# Altium schematic symbol library BARKO_SCHLIB.SchLib: 1064 symbols (part 1 of 11)
Pins are listed as number, name and electrical type; pins without a type are passive.

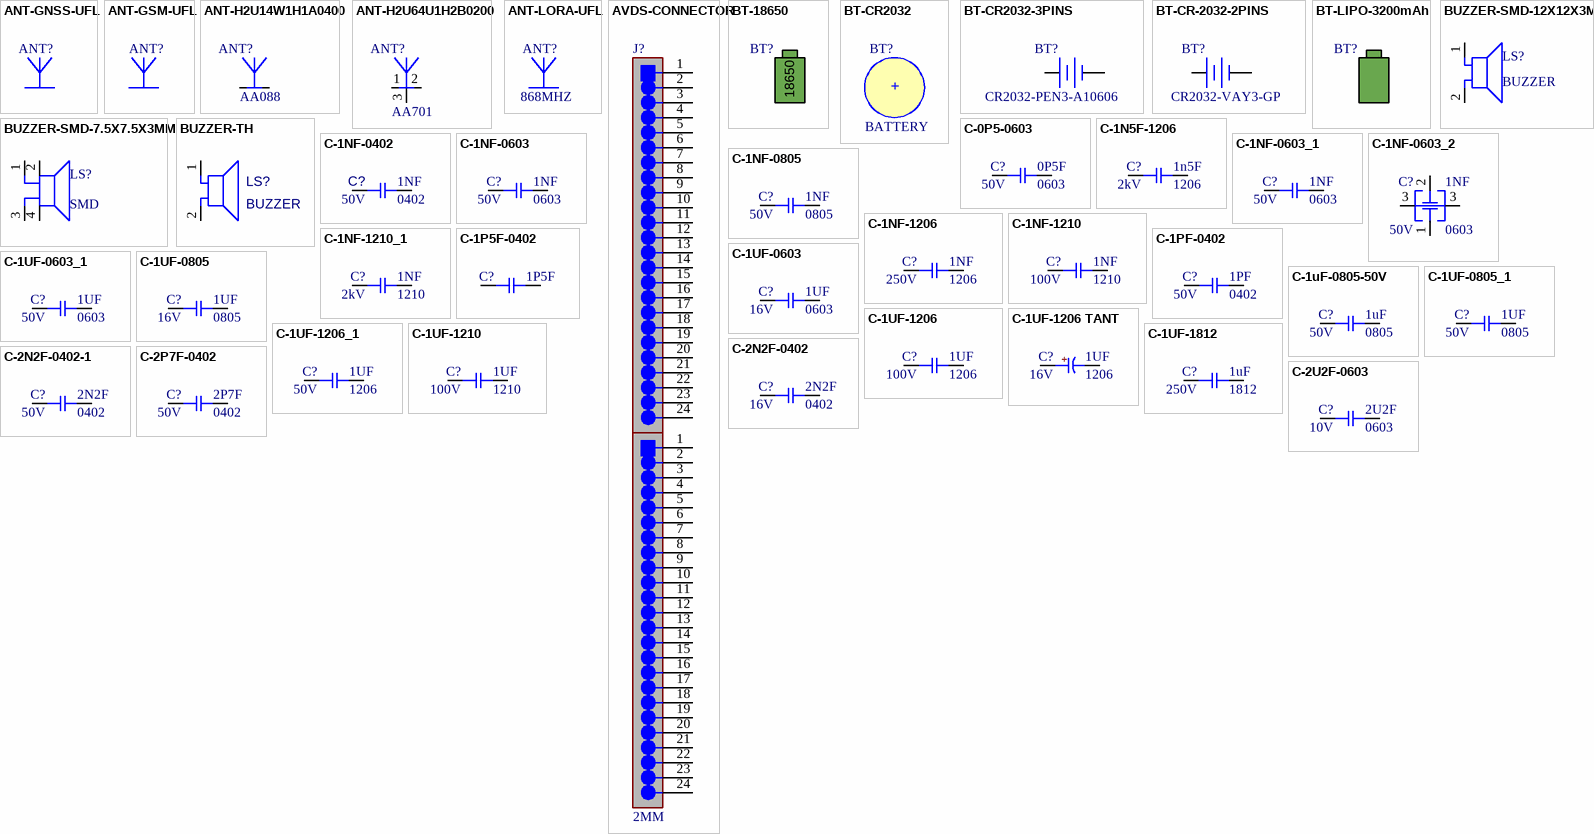
[diagram p0: symbols ANT-GNSS-UFL to C-2U2F-0603]

## ANT-GNSS-UFL
designator ANT?, comment 206560-0050  (value not drawn)  (net tie)
RF ANT 1.561/1.575GHZ FLAT 50MM; Manufacturer: Molex; Number of Bands: 3; Return Loss: -8dB; Washability: OK; .Creator: M.OZKAN; .PCBCHK: USED; Supplier: Digi-Key; Manufacturer Part Number: 206560-0050; RoHS: No; Supplier Part Number: WM22046-ND; Stock: 0; Supplier 1: Digi-Key; Supplier Part Number 1: WM22046-ND; Pricing: 1=2.8, 10=2.517, 25=2.3744, 100=2.0229, 250=1.8994, 500=1.662, 1000=1.3771, 2500=1.2821, 5000=1.2346 (USD); Mount: Adhesive; Termination: Cable; ComponentLink1URL: https://www.molex.com/pdm_docs/sd/2065600100_sd.pdf?src-supplier=Digi-Key; ComponentLink1Description: https://www.molex.com/pdm_docs/sd/2065600100_sd.pdf?src-supplier=Digi-Key; .SCHCHK: USED
footprint R-1206-ARRAY (SMD, 8-Leads, Body 1.6x3.2mm, Pitch 0.8mm)

## ANT-GSM-UFL
designator ANT?, comment ANT-GSMMQB-UFL  (value not drawn)  (net tie)
ANTENNA MINI GSM QUAD UF1 CONN; Manufacturer: RF Solutions; Number of Bands: 4; Gain: 1dB; Max Power Dissipation: 10W; Lead Length: 100mm; Washability: OK; .Creator: M.OZKAN; .PCBCHK: USED; Supplier: Digi-Key; Manufacturer Part Number: ANT-GSMMQB-UFL; Stock: 75; Pricing: 1=6,17000 (USD); RoHS: Yes; Mount: Adhesive; Termination: Connector; Package Quantity: 1; Height: 0.197inch; ComponentLink1URL: https://datasheet.ciiva.com/11768/0900766b80df9366-11768496.pdf?src-supplier=RSComponents; ComponentLink1Description: https://datasheet.ciiva.com/11768/0900766b80df9366-11768496.pdf?src-supplier=RSComponents; Supplier Part Number: ANT-GSMMQB-UFL-ND; Supplier 1: Digi-Key; Supplier Part Number 1: ANT-GSMMQB-UFL-ND; .SCHCHK: USED

## ANT-H2U14W1H1A0400
designator ANT?, comment AA088
GNSS 1560-1606 MHZ WIDE BAND TEL; Manufacturer Part Number: H2U14W1H1A0400; Washability: OK; .Creator: M.OZKAN; .PCBCHK: USED; ComponentLink1Description: Datasheet; ComponentLink1URL: https://www.unictron.com/wp-content/uploads/Unictron_AA088_GNSS_Chip_Antenna_F-1.pdf; .SCHCHK: USED
footprint ANT-GPS-2PIN (Chip Inductor, 2-Leads, Body 3.20x1.60mm, IPC Medium Density)
pins: 1 SIGNAL, 2

## ANT-H2U64U1H2B0200
designator ANT?, comment AA701
868MHZ ISM 863-870MHZ TELA CERAM; Manufacturer Part Number: H2U64U1H2B0200; Washability: OK; .Creator: M.OZKAN; .PCBCHK: USED; ComponentLink1Description: Datasheet; ComponentLink1URL: https://www.unictron.com/wp-content/uploads/Unictron_AA701_ISM_868MHz_Ceramic_Chip_Antenna_L.pdf; .SCHCHK: USED
footprint ANT-LORA-3PINS (Chip Inductor, 2-Leads, Body 5.00x3.00mm, IPC Medium Density)
pins: 1 SIGNAL, 2 Tuning/Ground, 3 NC

## ANT-LORA-UFL
designator ANT?, comment 868MHZ  (net tie)
RF ANTENNA ISM 868-870MHZ; Manufacturer: Ethertronics; Manufacturer Part Number: 1001826; Number of Bands: 1; Washability: OK; .Creator: M.OZKAN; .PCBCHK: USED; Supplier: Digi-Key; Stock: 10571; Pricing: 1=6,50000, 100=4,75000, 1000=4,35000 (USD); RoHS: Yes; Mount: Surface Mount; Termination: Connector; Package Quantity: 1000; Packaging: Bulk; Height: 0.031inch; ComponentLink1URL: https://datasheet.ciiva.com/29647/1001826-may2013-29647348.pdf?src-supplier=Digi-Key; ComponentLink1Description: https://datasheet.ciiva.com/29647/1001826-may2013-29647348.pdf?src-supplier=Digi-Key; Supplier Part Number: 939-1044-ND; Supplier 1: Digi-Key; Supplier Part Number 1: 939-1044-ND; .SCHCHK: USED

## AVDS-CONNECTOR
designator J?, comment 2MM
Washability: OK; .Creator: M.OZKAN; .PCBCHK: USED; .SCHCHK: USED
footprint AVDS-MODUL-HEADER
pins: 1, 1, 2, 2, 3, 3, 4, 4, 5, 5, 6, 6, 7, 7, 8, 8, 9, 9, 10, 10, 11, 11, 12, 12, 13, 13, 14, 14, 15, 15, 16, 16, 17, 17, 18, 18, 19, 19, 20, 20, 21, 21, 22, 22, 23, 23, 24, 24

## BT-18650
designator BT?, comment 18650
BATTERY LITHIUM 3.7V 2.6AH; Manufacturer 1: SparkFun; Manufacturer Part Number 1: PRT-13189; Washability: OK; .Creator: M.OZKAN; .PCBCHK: USED; Supplier 1: Digi-Key; Supplier Part Number 1: 1568-1490-ND; RoHS: No; Stock 1: 340; Pricing 1: 1=6.50000 (USD); Voltage Rating: 3.7V; Capacity: 2.6ah; Termination: Solder; ComponentLink1URL: https://cdn.sparkfun.com/datasheets/Prototyping/ICR18650%202600mAH%20datasheet.pdf?src-supplier=Digi-Key; ComponentLink1Description: https://cdn.sparkfun.com/datasheets/Prototyping/ICR18650%202600mAH%20datasheet.pdf?src-supplier=Digi-Key; .SCHCHK: USED

## BT-CR2032
designator BT?, comment BATTERY  (graphical)
BATTERY LITHIUM 3V COIN 20MM; Manufacturer: Panasonic BSG; Manufacturer Part Number: CR2032; Number of Cells: 1; Capacity: 225mAh; Washability: OK; .Creator: M.OZKAN; .PCBCHK: USED; Supplier 1: Digi-Key; Stock 1: 2819331; Pricing 1: 1=0.35000, 10=0.29000, 50=0.25560, 100=0.24110, 250=0.22444, 500=0.21220, 1000=0.20109, 2500=0.18665 (USD); RoHS: Yes; Mount: External; Weight: 0.1oz; Material: Lithium; Min Operating Temperature: -30°C; Max Operating Temperature: 60°C; Package Quantity: 200; Packaging: Tray; Voltage Rating (DC): 3V; Voltage: 3V; Chemistry/Technology: Lithium; Voltage Rating: 3V; Output Voltage: 3V; Diameter: 20mm; Height: 0.13inch; Radiation Hardening: No; Lead Free: Lead Free; ComponentLink1URL: https://datasheet.ciiva.com/2/crseries-datasheets-merged-2903.pdf?src-supplier=Digi-Key; ComponentLink1Description: https://datasheet.ciiva.com/2/crseries-datasheets-merged-2903.pdf?src-supplier=Digi-Key; ComponentLink2URL: https://datasheet.ciiva.com/12070/crseries-datasheets-merged-462862-12070381.pdf?src-supplier=Mouser; ComponentLink2Description: https://datasheet.ciiva.com/12070/crseries-datasheets-merged-462862-12070381.pdf?src-supplier=Mouser; ComponentLink3URL: https://datasheet.ciiva.com/2981/aaa4000ce51-2981326.pdf?src-supplier=Avnet; ComponentLink3Description: https://datasheet.ciiva.com/2981/aaa4000ce51-2981326.pdf?src-supplier=Avnet; ComponentLink4URL: https://datasheet.ciiva.com/16459/aaa4000ce51-16459422.pdf?src-supplier=Avnet+Asia; ComponentLink4Description: https://datasheet.ciiva.com/16459/aaa4000ce51-16459422.pdf?src-supplier=Avnet+Asia; Supplier Part Number 1: P189-ND; .SCHCHK: USED
text: +

## BT-CR2032-3PINS
designator BT?, comment CR2032-PEN3-A10606
BATTERY LITHIUM 3V COIN 20MM; Manufacturer: Panasonic BSG; Manufacturer Part Number: ML-2020/G1AN; Capacity: 45mAh; Washability: OK; .Creator: M.OZKAN; .PCBCHK: USED; Supplier 1: Digi-Key; Stock 1: 6826; Pricing 1: 1=2.52000, 10=2.09100, 50=1.84400, 100=1.74100, 400=1.61743, 800=1.53500, 1200=1.45258, 2800=1.38047 (USD); RoHS: No; Mount: Through Hole; Number of Pins: 3; Weight: 2.2g; Min Operating Temperature: -20°C; Max Operating Temperature: 60°C; Package Quantity: 200; Termination: Solder; Chemistry/Technology: Lithium; Output Voltage: 3V; Voltage Rating: 3V; Voltage: 3V; Diameter: 20mm; Length: 20mm; Height: 2mm; Depth: 20mm; Lead Free: Lead Free; ComponentLink1URL: https://datasheet.ciiva.com/2/panasonic-lithium-cr2032-cr2330-2903.pdf?src-supplier=Digi-Key; ComponentLink1Description: https://datasheet.ciiva.com/2/panasonic-lithium-cr2032-cr2330-2903.pdf?src-supplier=Digi-Key; ComponentLink2URL: https://datasheet.ciiva.com/5303/ml-2020-g1an-181535-5303072.pdf?src-supplier=Mouser; ComponentLink2Description: https://datasheet.ciiva.com/5303/ml-2020-g1an-181535-5303072.pdf?src-supplier=Mouser; ComponentLink3URL: https://datasheet.ciiva.com/3773/ml2020g1an-3773244.pdf?src-supplier=Arrow; ComponentLink3Description: https://datasheet.ciiva.com/3773/ml2020g1an-3773244.pdf?src-supplier=Arrow; Supplier Part Number 1: P046-ND; .SCHCHK: USED
footprint BT-CR2032-3 PINS
pins: 1 1,3, 2, 3

## BT-CR-2032-2PINS
designator BT?, comment CR2032-VAY3-GP
BATTERY LITHIUM 3V COIN 20MM; Manufacturer: Panasonic BSG; Manufacturer Part Number: CR-2032/HF1N; Capacity: 225mAh; Number of Cells: 1; Washability: OK; .Creator: M.OZKAN; .PCBCHK: USED; Supplier 1: Digi-Key; Stock 1: 17680; Pricing 1: 1=1.17000, 10=0.97300, 50=0.85560, 100=0.80780, 250=0.75132, 500=0.71226, 1000=0.67317, 2500=0.62539 (USD); RoHS: Yes; Mount: Through Hole; Min Operating Temperature: -30°C; Max Operating Temperature: 60°C; Package Quantity: 360; Chemistry/Technology: Lithium; Voltage Rating: 3V; Output Voltage: 3V; Packaging: Bulk; Termination: Through Hole; Voltage: 3V; Orientation: Horizontal; Diameter: 20mm; Height: 3.2mm; Radiation Hardening: No; Lead Free: Lead Free; ComponentLink1URL: https://datasheet.ciiva.com/26941/getdatasheetpartid-792005-26941171.pdf?src-supplier=Verical; ComponentLink1Description: https://datasheet.ciiva.com/26941/getdatasheetpartid-792005-26941171.pdf?src-supplier=Verical; ComponentLink2URL: https://datasheet.ciiva.com/24073/aad4000de237-259049-24073612.pdf?src-supplier=Mouser; ComponentLink2Description: https://datasheet.ciiva.com/24073/aad4000de237-259049-24073612.pdf?src-supplier=Mouser; ComponentLink3URL: https://datasheet.ciiva.com/3/aaa4000de87-3074.pdf?src-supplier=Digi-Key; ComponentLink3Description: https://datasheet.ciiva.com/3/aaa4000de87-3074.pdf?src-supplier=Digi-Key; Supplier Part Number 1: P658-ND; .SCHCHK: USED
footprint BT-CR2032-2PINS
pins: 1, 2

## BT-LIPO-3200mAh
designator BT?, comment PX6047103  (value not drawn)
Li-Polymer Battery 3.7V 3200 mAh; Manufacturer: Power-Xtra; Capacity: 3.2ah; Washability: OK; .Creator: M.OZKAN; .PCBCHK: USED; Manufacturer Part Number: PX6047103; RoHS: No; Voltage Rating: 3.7V; Termination: Solder; .SCHCHK: USED

## BUZZER-SMD-7.5X7.5X3MM
designator LS?  Case/Package: SMD  (hidden comment: *)
Manufacturer: Mallory Sonalert; Manufacturer Part Number: AST7525MATRQ; Frequency: 2.7kHz; Current Rating: 100mA; Voltage Rating: 3.6V; Min Supply Voltage: 2.5V; Max Supply Voltage: 4.5V; Sensing Method: Magnetic; .Creator: F:TALI; .PCBCHK: USED; Washability: OK; Supplier 1: Digi-Key; Stock 1: 16208; Pricing 1: 1=2.66, 10=2.114, 25=1.9236, 50=1.8006, 100=1.6776, 250=1.53216, 500=1.42032 (USD); Mount: Surface Mount; Color: Black; Min Operating Temperature: -30°C; Max Operating Temperature: 70°C; Packaging: Tape and Reel; Self Resonant Frequency: 2.7kHz; Operating Supply Current: 100mA; Termination: Solder; Length: 7.5mm; Height: 2.5mm; Width: 7.5mm; REACH SVHC: Unknown; ComponentLink1URL: http://www.mallory-sonalert.com/specifications/AST7525MATRQ.pdf; ComponentLink1Description: http://www.mallory-sonalert.com/specifications/AST7525MATRQ.pdf; ComponentLink2URL: http://www.farnell.com/datasheets/1916625.pdf; ComponentLink2Description: http://www.farnell.com/datasheets/1916625.pdf; ComponentLink3URL: http://www.mouser.com/ds/2/252/AST7525MATRQ-48037.pdf; ComponentLink3Description: http://www.mouser.com/ds/2/252/AST7525MATRQ-48037.pdf; ComponentLink4URL: https://www.mspindy.com/specifications/AST7525MATRQ.pdf; ComponentLink4Description: https://www.mspindy.com/specifications/AST7525MATRQ.pdf; Supplier Part Number 1: 458-1100-6-ND; .SCHCHK: USED
footprint BUZZER-SMD
pins: 1, 2, 3, 4

## BUZZER-SMD-12X12X3MM
designator LS?, comment BUZZER
.Creator: F:TALI; .PCBCHK: USED; Washability: OK; .SCHCHK: USED
footprint BUZZER-SMD-12X12X3MM
pins: 1, 2

## BUZZER-TH
designator LS?, comment BUZZER
AUDIO MAGNETIC XDCR 4-6V TH; Manufacturer: Soberton; Manufacturer Part Number: WST-1205S; Frequency: 2.3kHz; Voltage Rating: 5V; Operating Supply Current: 30mA; .Creator: F:TALI; .PCBCHK: USED; Washability: OK; Supplier 1: Digi-Key; Stock 1: 85503; Pricing 1: 1=1.41, 10=1.117, 25=1.0176, 50=0.9516, 100=0.8855, 250=0.80852, 500=0.7535, 1000=0.704, 5000=0.6875 (USD); Mount: Through Hole; Min Operating Temperature: -20°C; Max Operating Temperature: 60°C; Packaging: Bulk; Termination: PC Pins; Sensing Method: Magnetic; Self Resonant Frequency: 2.3kHz; Diameter: 12mm; Height: 9.5mm; Lead Free: Contains Lead; ComponentLink1URL: http://cirlw3yrzg4afc1x47lv2k18.wpengine.netdna-cdn.com/wp-content/uploads/2016/12/WST-1205S-new.pdf; ComponentLink1Description: http://cirlw3yrzg4afc1x47lv2k18.wpengine.netdna-cdn.com/wp-content/uploads/2016/12/WST-1205S-new.pdf; Supplier Part Number 1: 433-1029-ND; .SCHCHK: USED
footprint BUZZER-7.62MM-TH
pins: 1, 2

## C-0P5-0603
designator C?, comment 0603  Voltage Rating: 50V  Capacitance: 0P5F
CAP CER 0.5PF 50V C0G/NP0 0603; Manufacturer: Samsung; Manufacturer Part Number: CL10C0R5CB8NNNC; Material: Ceramic; Dielectric: C0G; .Creator: F:TALI; .PCBCHK: USED; Washability: OK; Supplier 1: Digi-Key; Stock 1: 4490; Pricing 1: 1=0.1, 10=0.043, 100=0.0189, 500=0.01352, 1000=0.01063 (USD); Mount: Surface Mount; Case/Package: 0603; Case Code (Metric): 1608; Case Code (Imperial): 0603; Min Operating Temperature: -55°C; Max Operating Temperature: 125°C; Packaging: Tape and Reel; Package Quantity: 1; Length: 1.6mm; Height: 0.8mm; Width: 0.031inch; Thickness: 0.035inch; Depth: 0.8mm; Radiation Hardening: No; ComponentLink1URL: https://www.verical.com/server-webapp/html/getDatasheet?partID=640153&src-supplier=Verical; ComponentLink1Description: https://www.verical.com/server-webapp/html/getDatasheet?partID=640153&src-supplier=Verical; ComponentLink2URL: https://media.digikey.com/pdf/Data%20Sheets/Samsung%20PDFs/CL_Series_MLCC_ds.pdf?src-supplier=Digi-Key; ComponentLink2Description: https://media.digikey.com/pdf/Data%20Sheets/Samsung%20PDFs/CL_Series_MLCC_ds.pdf?src-supplier=Digi-Key; ComponentLink3URL: http://www1.futureelectronics.com/doc/SAMSUNG/CLSERIES.pdf?src-supplier=Future+Electronics; ComponentLink3Description: http://www1.futureelectronics.com/doc/SAMSUNG/CLSERIES.pdf?src-supplier=Future+Electronics; ComponentLink4URL: https://produktinfo.conrad.com/datenblaetter/450000-474999/458330-da-01-en-VS_KONDENSATOR_0603.pdf?src-supplier=Conrad; ComponentLink4Description: https://produktinfo.conrad.com/datenblaetter/450000-474999/458330-da-01-en-VS_KONDENSATOR_0603.pdf?src-supplier=Conrad; Supplier Part Number 1: 1276-2147-6-ND; .SCHCHK: USED
footprint C-0603
pins: 1, 2

## C-1N5F-1206
designator C?, comment 1n5F  Voltage Rating: 2kV  Case/Package: 1206
CAP CER 1206 1.5NF 2000V X7R 10%; Manufacturer: KEMET; Manufacturer Part Number: C1206C152KGRACAUTO; Supplier 1: Digi-Key; Supplier Part Number 1: 399-16682-1-ND; Stock: 3969; Pricing: 1=0.47, 10=0.329, 50=0.23, 100=0.1972, 500=0.1479, 1000=0.1249 (USD); RoHS: No; Mount: Surface Mount; Case Code (Imperial): 1206; Case Code (Metric): 3216; Min Operating Temperature: -55°C; Max Operating Temperature: 125°C; Packaging: Tape and Reel; Capacitance: 1.5nF; Tolerance: 10%; Ratings: AEC-Q200; ComponentLink1URL: http://www.farnell.com/datasheets/2747429.pdf?src-supplier=Farnell; ComponentLink1Description: http://www.farnell.com/datasheets/2747429.pdf?src-supplier=Farnell; ComponentLink2URL: https://api.kemet.com/component-edge/download/datasheet/C1206C152KGRACAUTO.pdf?src-supplier=Digi-Key; ComponentLink2Description: https://api.kemet.com/component-edge/download/datasheet/C1206C152KGRACAUTO.pdf?src-supplier=Digi-Key; ComponentLink3URL: http://www.farnell.com/datasheets/2747429.pdf?src-supplier=Newark; ComponentLink3Description: http://www.farnell.com/datasheets/2747429.pdf?src-supplier=Newark; ComponentLink4URL: http://www.farnell.com/datasheets/2747429.pdf?src-supplier=Element14; ComponentLink4Description: http://www.farnell.com/datasheets/2747429.pdf?src-supplier=Element14; ComponentLink5URL: https://api.kemet.com/component-edge/download/specsheet/C1206C152KGRACAUTO.pdf?src-supplier=Digi-Key; ComponentLink5Description: https://api.kemet.com/component-edge/download/specsheet/C1206C152KGRACAUTO.pdf?src-supplier=Digi-Key
footprint C-1206
pins: 1, 2

## C-1NF-0402
designator C?, comment 1NF  Voltage Rating: 50V  Case Code (Imperial): 0402
CAP CER 1000PF 50V X7R 0402; Manufacturer: Samsung; Manufacturer Part Number: CL05B102KB5NNNC; Material: Ceramic; Tolerance: 10%; .PCBCHK: USED; .Creator: M.OZKAN; Washability: OK; Stock 1: 0; Pricing 1: 1=0.1, 10=0.032, 100=0.0141, 500=0.01006, 1000=0.00791, 2500=0.00719, 5000=0.00661 (USD); Mount: Surface Mount; Case/Package: 0402; Case Code (Metric): 1005; Contact Plating: Tin; Min Operating Temperature: -55°C; Max Operating Temperature: 125°C; Package Quantity: 1; Packaging: Tape and Reel; Capacitance: 1nF; Dielectric: X7R; Voltage: 50V; Voltage Rating (DC): 50V; Length: 1mm; Height: 0.5mm; Width: 0.02inch; Thickness: 0.022inch; Depth: 0.5mm; Radiation Hardening: No; Lead Free: Lead Free; ComponentLink1URL: http://www.samsungsem.com/kr/support/library/product-catalog/mlcc.jsp; ComponentLink1Description: http://www.samsungsem.com/kr/support/library/product-catalog/mlcc.jsp; ComponentLink2URL: https://www.verical.com/server-webapp/html/getDatasheet?partID=355276; ComponentLink2Description: https://www.verical.com/server-webapp/html/getDatasheet?partID=355276; ComponentLink3URL: https://www.distrelec.biz/Web/Downloads/_e/ng/MLCC_CatalogDownload2013_ENG.pdf?mime=application%2Fpdf; ComponentLink3Description: https://www.distrelec.biz/Web/Downloads/_e/ng/MLCC_CatalogDownload2013_ENG.pdf?mime=application%2Fpdf; ComponentLink4URL: https://produktinfo.conrad.com/datenblaetter/450000-474999/459222-da-01-en-VS_KONDENSATOR_0402.pdf; ComponentLink4Description: https://produktinfo.conrad.com/datenblaetter/450000-474999/459222-da-01-en-VS_KONDENSATOR_0402.pdf; Stock 2: 100000; Pricing 2: 1=0.1, 10=0.05, 100=0.0223, 500=0.01596, 1000=0.01254, 2500=0.0114, 5000=0.01049 (USD); Termination: SMD/SMT; Ratings: AEC-Q200; REACH SVHC: No SVHC; ComponentLink5URL: http://search.murata.co.jp/Ceramy/image/img/A01X/partnumbering_e_02.pdf; ComponentLink5Description: http://search.murata.co.jp/Ceramy/image/img/A01X/partnumbering_e_02.pdf; ComponentLink6URL: https://www.verical.com/server-webapp/html/getDatasheet?partID=140970; ComponentLink6Description: https://www.verical.com/server-webapp/html/getDatasheet?partID=140970; ComponentLink7URL: http://psearch.murata.com/capacitor/product/GCM155R71H102KA37%23.pdf; ComponentLink7Description: http://psearch.murata.com/capacitor/product/GCM155R71H102KA37%23.pdf; ComponentLink8URL: http://components.arrow.com/part/dataview/41888412S9779432N2606; ComponentLink8Description: http://components.arrow.com/part/dataview/41888412S9779432N2606; ComponentLink9URL: http://uk.rs-online.com/webdocs/0ef9/0900766b80ef92d0.pdf; ComponentLink9Description: http://uk.rs-online.com/webdocs/0ef9/0900766b80ef92d0.pdf; Stock 3: 100000; Pricing 3: 1=0.1, 10=0.053, 100=0.0237, 500=0.01692, 1000=0.0133, 2500=0.01209, 5000=0.01112 (USD); Features: Soft Termination; .SCHCHK: USED; Supplier 1: Digi-Key; Supplier Part Number 1: 1276-1032-6-ND
footprint C-0402
pins: 1, 2

## C-1NF-0603
designator C?, comment 1NF  Voltage Rating: 50V  Case/Package: 0603
CAP CER 1000PF 50V C0G 0603; Manufacturer: TDK; Manufacturer Part Number: C1608C0G1H102J080AA; Dielectric Material: Ceramic; Tolerance: 5%; Temperature Coefficient: 30ppm/°C; .PCBCHK: USED; .Creator: M.OZKAN; Washability: OK; Stock 1: 40000; Pricing 1: 1=0.22, 10=0.151, 100=0.0765, 500=0.05232, 1000=0.04629 (USD); Mount: Surface Mount; Number of Pins: 2; Weight: 7.1E-05oz; Case Code (Metric): 1608; Case Code (Imperial): 0603; Min Operating Temperature: -55°C; Max Operating Temperature: 125°C; Capacitance: 1nF; Dielectric: C0G; Packaging: Tape and Reel; Package Quantity: 1; Voltage Rating (DC): 50V; Termination: SMD/SMT; Voltage: 50V; Length: 1.6mm; Height: 0.8mm; Width: 0.031inch; Thickness: 0.037inch; Depth: 0.8mm; Radiation Hardening: No; REACH SVHC: No SVHC; Lead Free: Lead Free; ComponentLink1URL: http://www.farnell.com/datasheets/1796654.pdf; ComponentLink1Description: http://www.farnell.com/datasheets/1796654.pdf; ComponentLink2URL: https://product.tdk.com/info/en/documents/chara_sheet/C1608C0G1H102J080AA.pdf; ComponentLink2Description: https://product.tdk.com/info/en/documents/chara_sheet/C1608C0G1H102J080AA.pdf; ComponentLink3URL: http://www.tdk.co.jp/tefe02/e412_c.pdf; ComponentLink3Description: http://www.tdk.co.jp/tefe02/e412_c.pdf; ComponentLink4URL: http://www.farnell.com/datasheets/1744655.pdf; ComponentLink4Description: http://www.farnell.com/datasheets/1744655.pdf; ComponentLink5URL: http://www.farnell.com/datasheets/1571323.pdf; ComponentLink5Description: http://www.farnell.com/datasheets/1571323.pdf; ComponentLink6URL: http://www.mouser.com/ds/2/400/lcc_commercial_general_en-837201.pdf; ComponentLink6Description: http://www.mouser.com/ds/2/400/lcc_commercial_general_en-837201.pdf; Stock 2: 20721; Pricing 2: 1=0.1, 10=0.059, 100=0.0264, 500=0.01886, 1000=0.01482 (USD); Material: Ceramic; ComponentLink7URL: https://www.distrelec.biz/Web/Downloads/_e/ng/MLCC_CatalogDownload2013_ENG.pdf?mime=application%2Fpdf; ComponentLink7Description: https://www.distrelec.biz/Web/Downloads/_e/ng/MLCC_CatalogDownload2013_ENG.pdf?mime=application%2Fpdf; ComponentLink8URL: https://www.verical.com/server-webapp/html/getDatasheet?partID=354056; ComponentLink8Description: https://www.verical.com/server-webapp/html/getDatasheet?partID=354056; ComponentLink9URL: https://produktinfo.conrad.com/datenblaetter/450000-474999/458273-da-01-en-VS_KONDENSATOR_0603.pdf; ComponentLink9Description: https://produktinfo.conrad.com/datenblaetter/450000-474999/458273-da-01-en-VS_KONDENSATOR_0603.pdf; Stock 3: 100000; Pricing 3: 1=0.12, 10=0.088, 100=0.0413, 500=0.02894, 1000=0.02396, 2500=0.0223, 5000=0.0204 (USD); ComponentLink10URL: http://www.mouser.com/ds/2/281/c02e-2905.pdf; ComponentLink10Description: http://www.mouser.com/ds/2/281/c02e-2905.pdf; ComponentLink11URL: http://psearch.murata.com/capacitor/product/GRM1885C1H102JA01%23.pdf; ComponentLink11Description: http://psearch.murata.com/capacitor/product/GRM1885C1H102JA01%23.pdf; ComponentLink12URL: https://www.murata.com/~/media/webrenewal/support/library/catalog/products/capacitor/mlcc/c02e.ashx?la=en-us; ComponentLink12Description: https://www.murata.com/~/media/webrenewal/support/library/catalog/products/capacitor/mlcc/c02e.ashx?la=en-us; ComponentLink13URL: http://search.murata.co.jp/Ceramy/image/img/A01X/partnumbering_e_01.pdf; ComponentLink13Description: http://search.murata.co.jp/Ceramy/image/img/A01X/partnumbering_e_01.pdf; ComponentLink14URL: https://www.verical.com/server-webapp/html/getDatasheet?partID=212412; ComponentLink14Description: https://www.verical.com/server-webapp/html/getDatasheet?partID=212412; .SCHCHK: USED; Supplier 1: Digi-Key; Supplier Part Number 1: 445-1293-6-ND
footprint C-0603
pins: 1, 2

## C-1NF-0603_1
designator C?, comment 1NF  Voltage Rating: 50V  Case Code (Imperial): 0603
CAP CER 1000PF 50V X7R 0603; Manufacturer: Samsung; Manufacturer Part Number: CL10B102KB8NNNL; Tolerance: 10%; Dielectric Material: Ceramic; .PCBCHK: USED; .Creator: M.OZKAN; Washability: OK; Stock 1: 0; Pricing 1: 150000=0.00419 (USD); Mount: Surface Mount; Case/Package: 0603; Min Operating Temperature: -55°C; Max Operating Temperature: 125°C; Package Quantity: 15000; Packaging: Tape and Reel; Capacitance: 1nF; Dielectric: X7R; Voltage Rating (DC): 50V; Length: 1.6mm; Height: 0.8mm; Width: 0.031inch; Thickness: 0.035inch; Depth: 0.8mm; Radiation Hardening: No; Lead Free: Lead Free; ComponentLink1URL: https://www.verical.com/server-webapp/html/getDatasheet?partID=353267; ComponentLink1Description: https://www.verical.com/server-webapp/html/getDatasheet?partID=353267; Stock 2: 40000; Pricing 2: 1=0.1, 10=0.073, 100=0.0324, 500=0.02314, 1000=0.01818 (USD); Number of Pins: 2; Weight: 7.1E-05oz; Case Code (Metric): 1608; Contact Plating: Matte,Tin; Voltage: 50V; Termination: SMD/SMT; REACH SVHC: No SVHC; ComponentLink2URL: http://www.avx.com/docs/catalogs/cx7r.pdf; ComponentLink2Description: http://www.avx.com/docs/catalogs/cx7r.pdf; ComponentLink3URL: http://www.farnell.com/datasheets/1679506.pdf; ComponentLink3Description: http://www.farnell.com/datasheets/1679506.pdf; ComponentLink4URL: http://www.farnell.com/datasheets/2237835.pdf; ComponentLink4Description: http://www.farnell.com/datasheets/2237835.pdf; ComponentLink5URL: http://uk.rs-online.com/webdocs/02d4/0900766b802d4698.pdf; ComponentLink5Description: http://uk.rs-online.com/webdocs/02d4/0900766b802d4698.pdf; ComponentLink6URL: http://catalogs.avx.com/SurfaceMount.pdf; ComponentLink6Description: http://catalogs.avx.com/SurfaceMount.pdf; Stock 3: 24597; Pricing 3: 1=0.1, 10=0.07, 100=0.031, 500=0.02214, 1000=0.01739 (USD); ComponentLink7URL: http://www.vishay.com/docs/28548/vjw1bcbascomseries.pdf; ComponentLink7Description: http://www.vishay.com/docs/28548/vjw1bcbascomseries.pdf; ComponentLink8URL: http://www.farnell.com/datasheets/1805047.pdf; ComponentLink8Description: http://www.farnell.com/datasheets/1805047.pdf; .SCHCHK: USED; Supplier 1: Digi-Key; Supplier Part Number 1: 478-1215-6-ND
footprint C-0603
pins: 1, 2

## C-1NF-0603_2
designator C?, comment 1NF  Voltage Rating: 50V  Case Code (Imperial): 0603
CAP CER 1000PF 50V X7R 0603; Manufacturer: Johanson; Manufacturer Part Number: 500X14W102MV4T; Tolerance: 20%; .Creator: M.OZKAN; .PCBCHK: USED; Washability: OK; Supplier 1: Digi-Key; Stock 1: 4476; Pricing 1: 1=0.36, 10=0.247, 100=0.148, 500=0.111, 1000=0.09374 (USD); Mount: Surface Mount; Case/Package: 0603; Number of Pins: 4; Weight: 7.1E-05oz; Case Code (Metric): 1608; Min Operating Temperature: -55°C; Max Operating Temperature: 125°C; Capacitance: 1nF; Packaging: Tape and Reel; Voltage Rating (DC): 50V; Package Quantity: 4000; Dielectric: X7R; Termination: SMD/SMT; Length: 1.626mm; Height: 0.66mm; Width: 0.889mm; Thickness: 0.026inch; Depth: 0.889mm; REACH SVHC: No SVHC; Supplier Part Number 1: 709-1005-6-ND; Supplier 2: Digi-Key; Supplier Part Number 2: 311-1259-6-ND; Stock 2: 80898; Pricing 2: 1=0.85, 10=0.63, 100=0.4319, 500=0.34194, 1000=0.28794 (USD); Lead Free: Lead Free; ComponentLink1URL: http://www.yageo.com/NewPortal/_en/search/productDocs.jsp?YageoPartNumber=CX0603MRX7R0BB102&src-supplier=Digi-Key; ComponentLink1Description: http://www.yageo.com/NewPortal/_en/search/productDocs.jsp?YageoPartNumber=CX0603MRX7R0BB102&src-supplier=Digi-Key; ComponentLink2URL: https://media.digikey.com/pdf/Data%20Sheets/Yageo%20PDFs/X2Y%20Series,%206.3%20V%20to%20100%20V.pdf?src-supplier=Digi-Key; ComponentLink2Description: https://media.digikey.com/pdf/Data%20Sheets/Yageo%20PDFs/X2Y%20Series,%206.3%20V%20to%20100%20V.pdf?src-supplier=Digi-Key; .SCHCHK: USED
footprint C-0603-3 PAD
pins: 1, 2, 3, 3 4

## C-1NF-0805
designator C?, comment 1NF  Voltage Rating: 50V  Case/Package: 0805
CAP CER 1000PF 50V X7R 0805; Manufacturer: Samsung; Manufacturer Part Number: CL21B102KBANNNL; Tolerance: 10%; Dielectric Material: Ceramic; Insulation Resistance: 100GR; .PCBCHK: USED; .Creator: M.OZKAN; Washability: OK; Stock 1: 0; Pricing 1: 150000=0.00452 (USD); Mount: Surface Mount; Min Operating Temperature: -55°C; Max Operating Temperature: 125°C; Capacitance: 1nF; Dielectric: X7R; Packaging: Tape and Reel; Package Quantity: 15000; Voltage: 50V; Voltage Rating (DC): 50V; Length: 2mm; Height: 0.65mm; Depth: 1.25mm; Width: 0.049inch; Thickness: 0.03inch; Radiation Hardening: No; Lead Free: Lead Free; ComponentLink1URL: https://www.verical.com/server-webapp/html/getDatasheet?partID=355342; ComponentLink1Description: https://www.verical.com/server-webapp/html/getDatasheet?partID=355342; ComponentLink2URL: http://www.samsungsem.com/kr/front/downloadcms.do?path=/kr/support/product-search/mlcc/__icsFiles/afieldfile/2014/11/05&fileName=C_CL21B102KBANNNL.pdf; ComponentLink2Description: http://www.samsungsem.com/kr/front/downloadcms.do?path=/kr/support/product-search/mlcc/__icsFiles/afieldfile/2014/11/05&fileName=C_CL21B102KBANNNL.pdf; Stock 2: 40000; Pricing 2: 1=0.1, 10=0.043, 100=0.0191, 500=0.01366, 1000=0.01073 (USD); Case Code (Metric): 2012; Case Code (Imperial): 0805; ComponentLink3URL: https://media.digikey.com/pdf/Data%20Sheets/Samsung%20PDFs/CL_Series_MLCC_ds.pdf; ComponentLink3Description: https://media.digikey.com/pdf/Data%20Sheets/Samsung%20PDFs/CL_Series_MLCC_ds.pdf; ComponentLink4URL: https://www.verical.com/server-webapp/html/getDatasheet?partID=493724; ComponentLink4Description: https://www.verical.com/server-webapp/html/getDatasheet?partID=493724; Stock 3: 40000; Pricing 3: 1=0.14, 10=0.1, 100=0.0468, 500=0.03284, 1000=0.02718 (USD); Number of Pins: 2; Material: Ceramic; Termination: SMD/SMT; REACH SVHC: No SVHC; Halogen Free: Halogen Free; ComponentLink5URL: http://www.farnell.com/datasheets/1489800.pdf; ComponentLink5Description: http://www.farnell.com/datasheets/1489800.pdf; ComponentLink6URL: http://www.yageo.com/documents/recent/UPY-GPHC_X7R_6.3V-to-50V_18.pdf; ComponentLink6Description: http://www.yageo.com/documents/recent/UPY-GPHC_X7R_6.3V-to-50V_18.pdf; ComponentLink7URL: http://www.yageo.com/documents/recent/UPY-GPHC_X7R_6.3V-to-50V_8.pdf; ComponentLink7Description: http://www.yageo.com/documents/recent/UPY-GPHC_X7R_6.3V-to-50V_8.pdf; .SCHCHK: USED; Supplier 1: Digi-Key; Supplier Part Number 1: 1276-2425-1-ND
footprint C-0805
pins: 1, 2

## C-1NF-1206
designator C?, comment 1NF  Voltage Rating: 250V  Case Code (Imperial): 1206
CAP CER 1000PF 250V X7R 1206; Manufacturer: Kyocera AVX; Manufacturer Part Number: 1206PC102KAT1A; Tolerance: 10%; Dissipation Factor: 2.5%; .PCBCHK: USED; .Creator: M.OZKAN; Washability: OK; Stock 1: 12135; Pricing 1: 1=0.6, 10=0.424, 100=0.2795, 500=0.207, 1000=0.17595 (USD); Mount: Surface Mount; Case/Package: 1206; Number of Pins: 2; Case Code (Metric): 3216; Min Operating Temperature: -55°C; Max Operating Temperature: 125°C; Capacitance: 1nF; Package Quantity: 1; Packaging: Tape and Reel; Voltage Rating (DC): 250V; Termination: SMD/SMT; Length: 0.126inch; Height: 1.5mm; Width: 0.063inch; Thickness: 0.059inch; REACH SVHC: No SVHC; ComponentLink1URL: http://www.avx.com/docs/Catalogs/apt&r.pdf; ComponentLink1Description: http://www.avx.com/docs/Catalogs/apt&r.pdf; ComponentLink2URL: http://datasheets.avx.com/TipAndRing.pdf; ComponentLink2Description: http://datasheets.avx.com/TipAndRing.pdf; Dielectric: X7R; Stock 2: 1530; Pricing 2: 1=0.28, 10=0.195, 100=0.1107, 500=0.07816, 1000=0.06839 (USD); Stock 3: 2744; Pricing 3: 1=0.58, 10=0.411, 100=0.2709, 500=0.20068, 1000=0.17057 (USD); Features: Soft Termination; Ratings: AEC-Q200; .SCHCHK: USED; Supplier 1: Digi-Key; Supplier Part Number 1: 478-5552-6-ND
footprint C-1206
pins: 1, 2

## C-1NF-1210
designator C?, comment 1NF  Voltage Rating: 100V  Case Code (Imperial): 1210
CAP CER 1000PF 100V X7R 1210; Manufacturer: Kyocera AVX; Manufacturer Part Number: 12101C102KAT2A; Tolerance: 10%; Dissipation Factor: 2.5%; .PCBCHK: USED; .Creator: M.OZKAN; Washability: OK; Stock 1: 7412; Pricing 1: 1=0.52, 10=0.359, 100=0.2156, 500=0.16172, 1000=0.13656 (USD); Mount: Surface Mount; Case/Package: 1210; Number of Pins: 2; Case Code (Metric): 3225; Min Operating Temperature: -55°C; Max Operating Temperature: 125°C; Capacitance: 1nF; Packaging: Tape and Reel; Package Quantity: 1; Voltage Rating (DC): 100V; Dielectric: X7R; Termination: SMD/SMT; Length: 3.2mm; Width: 0.098inch; Thickness: 0.037inch; Depth: 2.5mm; REACH SVHC: Unknown; Lead Free: Lead Free; ComponentLink1URL: http://www.avx.com/docs/Catalogs/cx7r.pdf; ComponentLink1Description: http://www.avx.com/docs/Catalogs/cx7r.pdf; ComponentLink2URL: http://datasheets.avx.com/X7RDielectric.pdf; ComponentLink2Description: http://datasheets.avx.com/X7RDielectric.pdf; ComponentLink3URL: http://catalogs.avx.com/SurfaceMount.pdf; ComponentLink3Description: http://catalogs.avx.com/SurfaceMount.pdf; ComponentLink4URL: http://www.mouser.com/ds/2/40/X7RDielectric-777024.pdf; ComponentLink4Description: http://www.mouser.com/ds/2/40/X7RDielectric-777024.pdf; Stock 2: 2916; Pricing 2: 1=0.82, 10=0.582, 100=0.3835, 500=0.28406, 1000=0.24144 (USD); .SCHCHK: USED; Supplier 1: Digi-Key; Supplier Part Number 1: 478-1602-6-ND
footprint C-1210
pins: 1, 2

## C-1NF-1210_1
designator C?, comment 1NF  Voltage Rating: 2kV  Case/Package: 1210
CAP CER 1000PF 2KV X7R 1210; Manufacturer: Samsung; Manufacturer Part Number: CL32B102KJFNNNE; Tolerance: 10%; .PCBCHK: USED; .Creator: M.OZKAN; Washability: OK; Stock 1: 0; Pricing 1: 1=0.35, 10=0.243, 100=0.146, 500=0.1095, 1000=0.09247 (USD); Mount: Surface Mount; Case Code (Metric): 3225; Case Code (Imperial): 1210; Min Operating Temperature: -55°C; Max Operating Temperature: 125°C; Package Quantity: 1; Packaging: Tape and Reel; Capacitance: 1nF; Dielectric: X7R; Voltage Rating (DC): 2kV; Length: 3.2mm; Height: 1.25mm; Width: 0.098inch; Thickness: 0.057inch; Depth: 2.5mm; Radiation Hardening: No; Lead Free: Lead Free; ComponentLink1URL: https://www.verical.com/server-webapp/html/getDatasheet?partID=357612; ComponentLink1Description: https://www.verical.com/server-webapp/html/getDatasheet?partID=357612; Stock 2: 20000; Pricing 2: 1=0.52, 10=0.363, 100=0.2178, 500=0.16338, 1000=0.13796 (USD); Number of Pins: 2; Contact Plating: Tin; REACH SVHC: No SVHC; ComponentLink2URL: http://www.farnell.com/datasheets/1909358.pdf; ComponentLink2Description: http://www.farnell.com/datasheets/1909358.pdf; Stock 3: 5452; Pricing 3: 1=0.73, 10=0.538, 100=0.3692, 500=0.29224, 1000=0.2461 (USD); Termination: SMD/SMT; .SCHCHK: USED; Supplier 1: Digi-Key; Supplier Part Number 1: 1276-3316-1-ND
footprint C-1210
pins: 1, 2

## C-1P5F-0402
designator C?, comment 1P5F
CAP CER 1.5PF 50V C0G/NP0 0402; Manufacturer: Murata; Manufacturer Part Number: GJM1555C1H1R5BB01D; Dielectric: C0G; Temperature Coefficient: 30ppm/°C; Washability: OK; .Creator: M.OZKAN; .PCBCHK: USED; Supplier: Digi-Key; Stock: 472; Pricing: 1=0,19000, 10=0,13000, 100=0,06590, 500=0,04508, 1000=0,03987, 2500=0,03814, 5000=0,03467 (USD); RoHS: Yes; Mount: Surface Mount; Case/Package: 0402; Number of Pins: 2; Case Code (Metric): 1005; Case Code (Imperial): 0402; Min Operating Temperature: -55°C; Max Operating Temperature: 125°C; Capacitance: 1.5pF; Packaging: Tape and Reel; Package Quantity: 10000; Voltage Rating: 50V; Voltage Rating (DC): 50V; Termination: SMD/SMT; Voltage: 50V; Length: 1mm; Height: 0.5mm; Width: 0.5mm; Thickness: 0.022inch; Depth: 0.5mm; Lead Pitch: 0.3mm; Radiation Hardening: No; Lead Free: Lead Free; REACH SVHC: No SVHC; ComponentLink1URL: https://datasheet.ciiva.com/17453/product-17453480.pdf?src-supplier=Avnet+Europe; ComponentLink1Description: https://datasheet.ciiva.com/17453/product-17453480.pdf?src-supplier=Avnet+Europe; ComponentLink2URL: https://datasheet.ciiva.com/8030/1700191-8030107.pdf?src-supplier=Element14; ComponentLink2Description: https://datasheet.ciiva.com/8030/1700191-8030107.pdf?src-supplier=Element14; ComponentLink3URL: https://datasheet.ciiva.com/26843/getdatasheetpartid-698463-26843693.pdf?src-supplier=Verical; ComponentLink3Description: https://datasheet.ciiva.com/26843/getdatasheetpartid-698463-26843693.pdf?src-supplier=Verical; ComponentLink4URL: https://datasheet.ciiva.com/29542/partnumbering-e-01-29542725.pdf?src-supplier=Digi-Key; ComponentLink4Description: https://datasheet.ciiva.com/29542/partnumbering-e-01-29542725.pdf?src-supplier=Digi-Key; ComponentLink5URL: https://datasheet.ciiva.com/29542/partnumbering-e-01-29542726.pdf?src-supplier=Digi-Key; ComponentLink5Description: https://datasheet.ciiva.com/29542/partnumbering-e-01-29542726.pdf?src-supplier=Digi-Key; ComponentLink6URL: https://datasheet.ciiva.com/16440/l0005e-16440473.pdf?src-supplier=Future+Electronics; ComponentLink6Description: https://datasheet.ciiva.com/16440/l0005e-16440473.pdf?src-supplier=Future+Electronics; Supplier Part Number: 490-8087-1-ND; Supplier 1: Digi-Key; Supplier Part Number 1: 490-8087-1-ND; .SCHCHK: USED
footprint C-0402
pins: 1, 2

## C-1PF-0402
designator C?, comment 1PF  Voltage: 50V  Case/Package: 0402
CAP CER 1PF 50V C0G/NP0 0402; Manufacturer: Murata; Manufacturer Part Number: GJM1555C1H1R0BB01D; Temperature Coefficient: 30ppm/°C; Dielectric: C0G; Washability: OK; .Creator: M.OZKAN; .PCBCHK: USED; Supplier: Digi-Key; Stock: 387188; Pricing: 1=0,19000, 10=0,13000, 100=0,06590, 500=0,04508, 1000=0,03987, 2500=0,03814, 5000=0,03467 (USD); RoHS: Yes; Mount: Surface Mount; Number of Pins: 2; Case Code (Metric): 1005; Case Code (Imperial): 0402; Min Operating Temperature: -55°C; Max Operating Temperature: 125°C; Voltage Rating (DC): 50V; Capacitance: 1pF; Voltage Rating: 50V; Packaging: Tape and Reel; Package Quantity: 10000; Termination: SMD/SMT; Length: 1mm; Height: 0.5mm; Width: 0.02inch; Thickness: 0.022inch; Lead Pitch: 0.3mm; Depth: 0.5mm; Radiation Hardening: No; Lead Free: Lead Free; REACH SVHC: No SVHC; ComponentLink1URL: https://datasheet.ciiva.com/2989/product-2989251.pdf?src-supplier=Avnet; ComponentLink1Description: https://datasheet.ciiva.com/2989/product-2989251.pdf?src-supplier=Avnet; ComponentLink2URL: https://datasheet.ciiva.com/8030/1700185-8030099.pdf?src-supplier=Element14; ComponentLink2Description: https://datasheet.ciiva.com/8030/1700185-8030099.pdf?src-supplier=Element14; ComponentLink3URL: https://datasheet.ciiva.com/18183/getdatasheetpartid-153061-18183816.pdf?src-supplier=Verical; ComponentLink3Description: https://datasheet.ciiva.com/18183/getdatasheetpartid-153061-18183816.pdf?src-supplier=Verical; ComponentLink4URL: https://datasheet.ciiva.com/11789/0900766b80ef921d-11789098.pdf?src-supplier=RSComponents; ComponentLink4Description: https://datasheet.ciiva.com/11789/0900766b80ef921d-11789098.pdf?src-supplier=RSComponents; ComponentLink5URL: https://datasheet.ciiva.com/6270/partnumbering-e-01-6270536.pdf?src-supplier=Digi-Key; ComponentLink5Description: https://datasheet.ciiva.com/6270/partnumbering-e-01-6270536.pdf?src-supplier=Digi-Key; ComponentLink6URL: https://datasheet.ciiva.com/6270/partnumbering-e-01-6270537.pdf?src-supplier=Digi-Key; ComponentLink6Description: https://datasheet.ciiva.com/6270/partnumbering-e-01-6270537.pdf?src-supplier=Digi-Key; ComponentLink7URL: https://datasheet.ciiva.com/6270/partnumbering-e-01-6270538.pdf?src-supplier=Digi-Key; ComponentLink7Description: https://datasheet.ciiva.com/6270/partnumbering-e-01-6270538.pdf?src-supplier=Digi-Key; Supplier Part Number: 490-6073-1-ND; Supplier 1: Digi-Key; Supplier Part Number 1: 490-6073-1-ND; .SCHCHK: USED
footprint C-0402
pins: 1, 2

## C-1UF-0603
designator C?, comment 1UF  Voltage Rating: 16V  Case Code (Imperial): 0603